# Altium footprint library devices.PCBLIB: 335 footprints (part 3 of 21)
Each footprint in its own frame and in the unit in brackets; x right, y up, seen from the top. Pads: shape width x height; smd on the part's side, far side on the other; paste and mask are expansions set on the pad; w line width, h text height; cw(c..) or ccw(c..) is an arc to the next point about the centre after c.
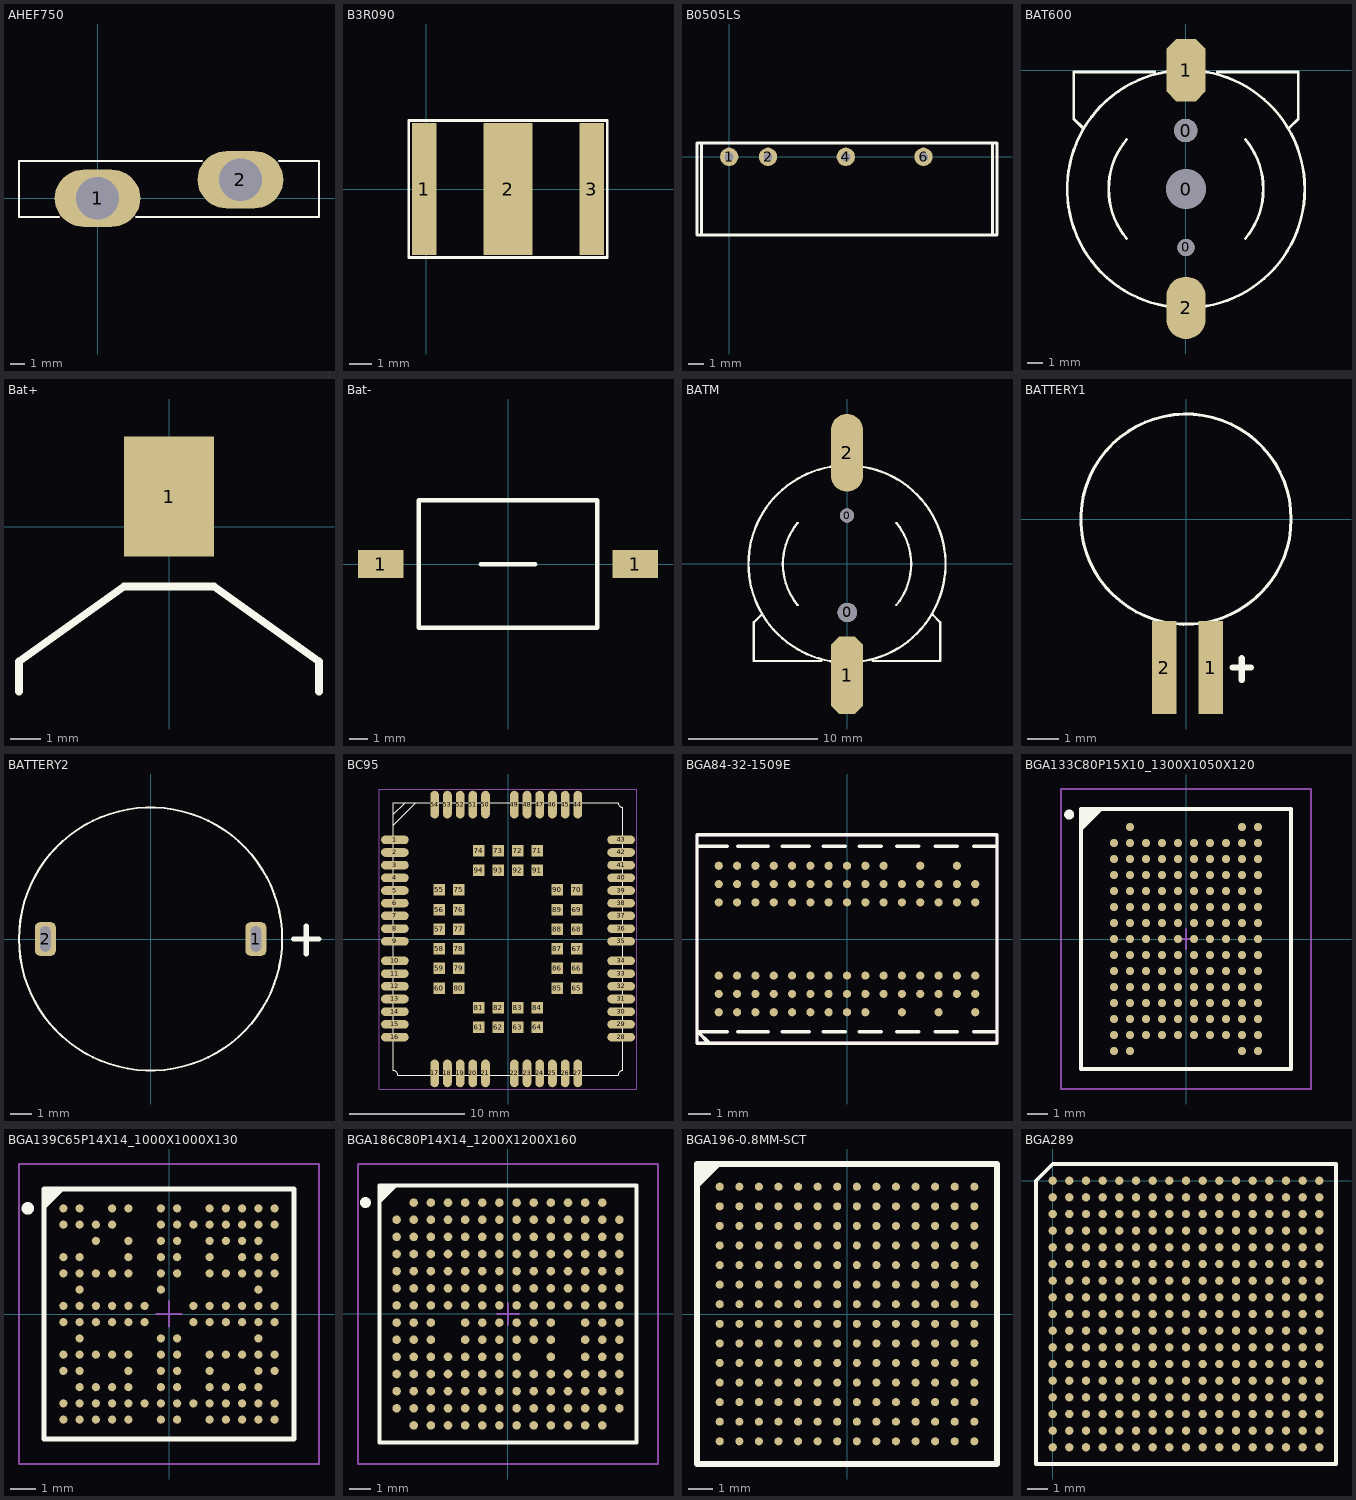
[diagram p2: the footprints below, top view; thin cyan lines are the x and y axes]

## AHEF750 [mm]
pads (2):
  oval 6x4 hole 3: 1(0,0) 2(10,1.3)
Top Overlay:
  lines w0.127: -2.7,-1.3 -5,-1.3 -5.5,-1.3 -5.5,2.6 -5,2.6 7.3,2.6 ; 2.7,-1.3 15,-1.3 15.5,-1.3 15.5,2.6 15,2.6 12.7,2.6

## B3R090 [mm]
pads (3):
  rect 1.1x6 smd: 1(-0.1,0) 3(7.5,0)
  rect 2.2x6 smd: 2(3.7,0)
Top Overlay:
  lines w0.127: -0.8,-3.1 8.2,-3.1 8.2,3.1 -0.8,3.1 -0.8,-3.1

## B0505LS [mm]
pads (4):
  round 1.2 hole 0.6: 1(0,0) 2(2.54,0) 4(7.62,0) 6(12.7,0)
Top Overlay:
  lines w0.2: -1.8,-5.1 -1.8,0.9 ; 17.2,-5.1 17.2,0.9 ; -2.1,-5.1 17.5,-5.1 17.5,0.9 -2.1,0.9 -2.1,-5.1

## BAT600 [mm]
pads (5):
  round 1.5 hole 1.5: 0(-0.014,-3.866)
  round 1.1 hole 1.1: 0(0.011,-11.366)
  round 2.54 hole 2.54: 0(0.011,-7.616)
  oct 2.5x4 smd: 1(0.011,0.004)
  oval 2.5x4 smd: 2(0.011,-15.236)
Top Overlay:
  lines w0.178: -6.614,-3.691 -7.189,-3.116 -7.189,-0.116 -1.989,-0.116 ; -3.802,-10.788 cw(c0.011,-7.616) -3.799,-4.441 ; -0.823,-15.19 cw(c0.011,-7.616) -0.823,-0.042 ; 0.844,-15.19 ccw(c0.011,-7.616) 7.631,-7.616 ccw(c0.011,-7.616) 0.844,-0.042 ; 2.011,-0.116 7.211,-0.116 7.211,-3.116 6.611,-3.716 ; 3.823,-10.788 ccw(c0.011,-7.616) 3.825,-4.447

## Bat+ [mm]
pads (1):
  rect 3x4 smd: 1(0,1)
Top Overlay:
  lines w0.254: -5,-5.5 -5,-4.5 -1.5,-2 1.5,-2 5,-4.5 5,-5.5

## Bat- [mil]
pads (2):
  rect 98x60 smd: 1(-275.59,0) 1(275.59,0)
Top Overlay:
  lines w10: -59.06,-0.87 59.06,-0.87 ; -192.91,-137.8 -192.91,137.8 192.91,137.8 192.91,-137.8 -192.91,-137.8

## BATM [mm]
pads (4):
  round 1.1 hole 1.1 unplated: 0(0,3.748)
  round 1.5 hole 1.5 unplated: 0(0.025,-3.752)
  oct 2.5x6 smd: 1(0,-8.602)
  oval 2.5x6 smd: 2(0,8.598)
Top Overlay:
  lines w0.178: -6.6,-3.902 -7.2,-4.502 -7.2,-7.502 -2,-7.502 ; -3.815,-3.171 cw(c0,-0.002) -3.812,3.171 ; -0.833,-7.576 cw(c0,-0.002) -7.62,-0.002 cw(c0,-0.002) -0.833,7.573 ; 0.833,-7.576 ccw(c0,-0.002) 0.833,7.573 ; 2,-7.502 7.2,-7.502 7.2,-4.502 6.625,-3.927 ; 3.81,-3.177 ccw(c0,-0.002) 3.812,3.171

## BATTERY1 [mm] "BAT1"
pads (2):
  rect 0.8x3 smd: 1(0.8,-4.8) 2(-0.7,-4.8)
Top Overlay:
  circle w0.1: c0,0 r3.4
  lines w0.2: 1.5,-4.8 2.1,-4.8 ; 1.8,-5.2 1.8,-4.5

## BATTERY2 [mm] "BAT"
height 5
pads (2):
  rrect50% 1x1.6 hole 0.5 slot 1.2 at 90 deg: 1(5,0) 2(-5,0)
Top Overlay:
  circle w0.1: c0,0 r6.25
  lines w0.254: 6.8,0 8,0 ; 7.4,-0.7 7.4,0.6

## BC95 [mm]
pads (94):
  oval 2.4x0.75 smd: 1(-9.8,8.6) 2(-9.8,7.5) 3(-9.8,6.4) 4(-9.8,5.3) 5(-9.8,4.2) 6(-9.8,3.1) 7(-9.8,2) 8(-9.8,0.9) 9(-9.8,-0.2) 10(-9.8,-1.9) 11(-9.8,-3) 12(-9.8,-4.1) 13(-9.8,-5.2) 14(-9.8,-6.3) 15(-9.8,-7.4) 16(-9.8,-8.5) 28(9.8,-8.5) 29(9.8,-7.4) 30(9.8,-6.3) 31(9.8,-5.2) 32(9.8,-4.1) 33(9.8,-3) 34(9.8,-1.9) 35(9.8,-0.2) 36(9.8,0.9) 37(9.8,2) 38(9.8,3.1) 39(9.8,4.2) 40(9.8,5.3) 41(9.8,6.4) 42(9.8,7.5) 43(9.8,8.6)
  oval 0.75x2.4 smd: 17(-6.35,-11.65) 18(-5.25,-11.65) 19(-4.15,-11.65) 20(-3.05,-11.65) 21(-1.95,-11.65) 22(0.55,-11.65) 23(1.65,-11.65) 24(2.75,-11.65) 25(3.85,-11.65) 26(4.95,-11.65) 27(6.05,-11.65) 44(6.05,11.65) 45(4.95,11.65) 46(3.85,11.65) 47(2.75,11.65) 48(1.65,11.65) 49(0.55,11.65) 50(-1.95,11.65) 51(-3.05,11.65) 52(-4.15,11.65) 53(-5.25,11.65) 54(-6.35,11.65)
  rect 1x1 smd: 55(-5.95,4.25) 56(-5.95,2.55) 57(-5.95,0.85) 58(-5.95,-0.85) 59(-5.95,-2.55) 60(-5.95,-4.25) 61(-2.55,-7.65) 62(-0.85,-7.65) 63(0.85,-7.65) 64(2.55,-7.65) 65(5.95,-4.25) 66(5.95,-2.55) 67(5.95,-0.85) 68(5.95,0.85) 69(5.95,2.55) 70(5.95,4.25) 71(2.55,7.65) 72(0.85,7.65) 73(-0.85,7.65) 74(-2.55,7.65) 75(-4.25,4.25) 76(-4.25,2.55) 77(-4.25,0.85) 78(-4.25,-0.85) 79(-4.25,-2.55) 80(-4.25,-4.25) 81(-2.55,-5.95) 82(-0.85,-5.95) 83(0.85,-5.95) 84(2.55,-5.95) 85(4.25,-4.25) 86(4.25,-2.55) 87(4.25,-0.85) 88(4.25,0.85) 89(4.25,2.55) 90(4.25,4.25) 91(2.55,5.95) 92(0.85,5.95) 93(-0.85,5.95) 94(-2.55,5.95)
Top Overlay:
  lines w0.1: -9.95,9.851 -8.001,11.8 -9.271,11.8 ; -9.95,10.033 -9.95,11.375 ; -9.95,10.414 -9.95,11.8 ; -9.931,10.82 -8.966,11.786 ; -8.437,11.8 -9.95,11.8 ; -9.95,11.8 9.55,11.8 ccw(c9.95,11.8) 9.95,11.4 9.95,-11.4 ccw(c9.95,-11.8) 9.55,-11.8 -9.55,-11.8 ccw(c-9.95,-11.8) -9.95,-11.4 -9.95,11.8
Mechanical 1:
  lines w0.01: -11.15,-13 -11.15,13 11.15,13 11.15,-13 -11.15,-13

## BGA84-32-1509E [mil] "BGA84-32-1509E"
pads (84):
  round 14 smd: A1(-220.47,-125.98) A2(-220.47,-94.49) A3(-220.47,-62.99) A7(-220.47,62.99) A8(-220.47,94.49) A9(-220.47,125.98) B1(-188.98,-125.98) B2(-188.98,-94.49) B3(-188.98,-62.99) B7(-188.98,62.99) B8(-188.98,94.49) B9(-188.98,125.98) C1(-157.48,-125.98) C2(-157.48,-94.49) C3(-157.48,-62.99) C7(-157.48,62.99) C8(-157.48,94.49) C9(-157.48,125.98) D1(-125.98,-125.98) D2(-125.98,-94.49) D3(-125.98,-62.99) D7(-125.98,62.99) D8(-125.98,94.49) D9(-125.98,125.98) E1(-94.49,-125.98) E2(-94.49,-94.49) E3(-94.49,-62.99) E7(-94.49,62.99) E8(-94.49,94.49) E9(-94.49,125.98) F1(-62.99,-125.98) F2(-62.99,-94.49) F3(-62.99,-62.99) F7(-62.99,62.99) F8(-62.99,94.49) F9(-62.99,125.98) G1(-31.5,-125.98) G2(-31.5,-94.49) G3(-31.5,-62.99) G7(-31.5,62.99) G8(-31.5,94.49) G9(-31.5,125.98) H1(0,-125.98) H2(0,-94.49) H3(0,-62.99) H7(0,62.99) H8(0,94.49) H9(0,125.98) J1(31.5,-125.98) J2(31.5,-94.49) J3(31.5,-62.99) J7(31.5,62.99) J8(31.5,94.49) J9(31.5,125.98) K2(62.99,-94.49) K3(62.99,-62.99) K7(62.99,62.99) K8(62.99,94.49) K9(62.99,125.98) L1(94.49,-125.98) L2(94.49,-94.49) L3(94.49,-62.99) L7(94.49,62.99) L8(94.49,94.49) M2(125.98,-94.49) M3(125.98,-62.99) M7(125.98,62.99) M8(125.98,94.49) M9(125.98,125.98) N1(157.48,-125.98) N2(157.48,-94.49) N3(157.48,-62.99) N7(157.48,62.99) N8(157.48,94.49) P2(188.98,-94.49) P3(188.98,-62.99) P7(188.98,62.99) P8(188.98,94.49) P9(188.98,125.98) R1(220.47,-125.98) R2(220.47,-94.49) R3(220.47,-62.99) R7(220.47,62.99) R8(220.47,94.49)
Top Overlay:
  lines w6: -254.62,159.45 -205.62,159.45 ; -238.11,-177.94 -254.62,-161.43 -254.62,-159.45 -205.62,-159.45 ; -188,-159.45 -135,-159.45 ; -188,159.45 -135,159.45 ; -111,-159.45 -65,-159.45 ; -111,159.45 -65,159.45 ; -40.75,-159.45 -2.87,-159.45 ; -40.75,159.45 -2.87,159.45 ; 20.89,-159.45 58.77,-159.45 ; 20.89,159.45 58.77,159.45 ; 85.73,-159.45 123.61,-159.45 ; 85.73,159.45 123.61,159.45 ; 151.77,-159.45 189.65,-159.45 ; 151.77,159.45 189.65,159.45 ; 217.87,-159.45 255.75,-159.45 ; 217.87,159.45 255.75,159.45 ; -257.87,-179.13 -257.87,179.13 257.87,179.13 257.87,-179.13 -257.87,-179.13
Mechanical 11:
  lines w6: -257.87,-179.13 -257.87,179.13 257.87,179.13 257.87,-179.13 -257.87,-179.13

## BGA133C80P15X10_1300X1050X120 [mm] "BGA, 133-Leads, Body 13.0x10.5mm,  Pitch 0.80mm"
height 1.2
pads (137):
  round 0.41 smd: A2(-2.8,5.6) A9(2.8,5.6) A10(3.6,5.6) B1(-3.6,4.8) B2(-2.8,4.8) B3(-2,4.8) B4(-1.2,4.8) B5(-0.4,4.8) B6(0.4,4.8) B7(1.2,4.8) B8(2,4.8) B9(2.8,4.8) B10(3.6,4.8) C1(-3.6,4) C2(-2.8,4) C3(-2,4) C4(-1.2,4) C5(-0.4,4) C6(0.4,4) C7(1.2,4) C8(2,4) C9(2.8,4) C10(3.6,4) D1(-3.6,3.2) D2(-2.8,3.2) D3(-2,3.2) D4(-1.2,3.2) D5(-0.4,3.2) D6(0.4,3.2) D7(1.2,3.2) D8(2,3.2) D9(2.8,3.2) D10(3.6,3.2) E1(-3.6,2.4) E2(-2.8,2.4) E3(-2,2.4) E4(-1.2,2.4) E5(-0.4,2.4) E6(0.4,2.4) E7(1.2,2.4) E8(2,2.4) E9(2.8,2.4) E10(3.6,2.4) F1(-3.6,1.6) F2(-2.8,1.6) F3(-2,1.6) F4(-1.2,1.6) F5(-0.4,1.6) F6(0.4,1.6) F7(1.2,1.6) F8(2,1.6) F9(2.8,1.6) F10(3.6,1.6) G1(-3.6,0.8) G2(-2.8,0.8) G3(-2,0.8) G4(-1.2,0.8) G5(-0.4,0.8) G6(0.4,0.8) G7(1.2,0.8) G8(2,0.8) G9(2.8,0.8) G10(3.6,0.8) H1(-3.6,0) H2(-2.8,0) H3(-2,0) H4(-1.2,0) H5(-0.4,0) H6(0.4,0) H7(1.2,0) H8(2,0) H9(2.8,0) H10(3.6,0) J1(-3.6,-0.8) J2(-2.8,-0.8) J3(-2,-0.8) J4(-1.2,-0.8) J5(-0.4,-0.8) J6(0.4,-0.8) J7(1.2,-0.8) J8(2,-0.8) J9(2.8,-0.8) J10(3.6,-0.8) K1(-3.6,-1.6) K2(-2.8,-1.6) K3(-2,-1.6) K4(-1.2,-1.6) K5(-0.4,-1.6) K6(0.4,-1.6) K7(1.2,-1.6) K8(2,-1.6) K9(2.8,-1.6) K10(3.6,-1.6) L1(-3.6,-2.4) L2(-2.8,-2.4) L3(-2,-2.4) L4(-1.2,-2.4) L5(-0.4,-2.4) L6(0.4,-2.4) L7(1.2,-2.4) L8(2,-2.4) L9(2.8,-2.4) L10(3.6,-2.4) M1(-3.6,-3.2) M2(-2.8,-3.2) M3(-2,-3.2) M4(-1.2,-3.2) M5(-0.4,-3.2) M6(0.4,-3.2) M7(1.2,-3.2) M8(2,-3.2) M9(2.8,-3.2) M10(3.6,-3.2) N1(-3.6,-4) N2(-2.8,-4) N3(-2,-4) N4(-1.2,-4) N5(-0.4,-4) N6(0.4,-4) N7(1.2,-4) N8(2,-4) N9(2.8,-4) N10(3.6,-4) P1(-3.6,-4.8) P2(-2.8,-4.8) P3(-2,-4.8) P4(-1.2,-4.8) P5(-0.4,-4.8) P6(0.4,-4.8) P7(1.2,-4.8) P8(2,-4.8) P9(2.8,-4.8) P10(3.6,-4.8) R1(-3.6,-5.6) R2(-2.8,-5.6) R9(2.8,-5.6) R10(3.6,-5.6)
Top Overlay:
  circle w0.25: c-5.84,6.223 r0.125
  region: -4.25,6.5 -5.25,5.5 -5.25,6.5
  lines w0.2: -5.25,5.5 -4.25,6.5 ; -5.25,-6.5 5.25,-6.5 5.25,6.5 -5.25,6.5 -5.25,-6.5
Mechanical 13:
  lines w0.1: -5.25,-6.5 5.25,-6.5 5.25,6.5 -5.25,6.5 -5.25,-6.5
Mechanical 15:
  lines w0.1: -0.5,0 0.5,0 ; 0,-0.5 0,0.5 ; -6.25,-7.5 6.25,-7.5 6.25,7.5 -6.25,7.5 -6.25,-7.5
3D body: height 1.2, standoff 0.25, extent -5.25,-6.5 5.25,6.5

## BGA139C65P14X14_1000X1000X130 [mm] "BGA, 139-Leads, Body 10.0x10.0mm,  Pitch 0.65mm"
height 1.3
pads (139):
  round 0.33 smd: A1(-4.225,4.225) A2(-3.575,4.225) A4(-2.275,4.225) A5(-1.625,4.225) A7(-0.325,4.225) A8(0.325,4.225) A10(1.625,4.225) A11(2.275,4.225) A12(2.925,4.225) A13(3.575,4.225) A14(4.225,4.225) B1(-4.225,3.575) B2(-3.575,3.575) B3(-2.925,3.575) B4(-2.275,3.575) B7(-0.325,3.575) B8(0.325,3.575) B9(0.975,3.575) B10(1.625,3.575) B11(2.275,3.575) B12(2.925,3.575) B13(3.575,3.575) B14(4.225,3.575) C3(-2.925,2.925) C5(-1.625,2.925) C7(-0.325,2.925) C8(0.325,2.925) C10(1.625,2.925) C11(2.275,2.925) C12(2.925,2.925) C13(3.575,2.925) D1(-4.225,2.275) D2(-3.575,2.275) D5(-1.625,2.275) D7(-0.325,2.275) D8(0.325,2.275) D10(1.625,2.275) D12(2.925,2.275) D13(3.575,2.275) D14(4.225,2.275) E1(-4.225,1.625) E2(-3.575,1.625) E3(-2.925,1.625) E4(-2.275,1.625) E5(-1.625,1.625) E7(-0.325,1.625) E8(0.325,1.625) E10(1.625,1.625) E11(2.275,1.625) E12(2.925,1.625) E13(3.575,1.625) E14(4.225,1.625) F2(-3.575,0.975) F7(-0.325,0.975) F13(3.575,0.975) G1(-4.225,0.325) G2(-3.575,0.325) G3(-2.925,0.325) G4(-2.275,0.325) G5(-1.625,0.325) G6(-0.975,0.325) G9(0.975,0.325) G10(1.625,0.325) G11(2.275,0.325) G12(2.925,0.325) G13(3.575,0.325) G14(4.225,0.325) H1(-4.225,-0.325) H2(-3.575,-0.325) H3(-2.925,-0.325) H4(-2.275,-0.325) H5(-1.625,-0.325) H6(-0.975,-0.325) H9(0.975,-0.325) H10(1.625,-0.325) H11(2.275,-0.325) H12(2.925,-0.325) H13(3.575,-0.325) H14(4.225,-0.325) J2(-3.575,-0.975) J7(-0.325,-0.975) J8(0.325,-0.975) J13(3.575,-0.975) K1(-4.225,-1.625) K2(-3.575,-1.625) K3(-2.925,-1.625) K4(-2.275,-1.625) K5(-1.625,-1.625) K7(-0.325,-1.625) K8(0.325,-1.625) K10(1.625,-1.625) K11(2.275,-1.625) K12(2.925,-1.625) K13(3.575,-1.625) K14(4.225,-1.625) L1(-4.225,-2.275) L2(-3.575,-2.275) L5(-1.625,-2.275) L7(-0.325,-2.275) L8(0.325,-2.275) L10(1.625,-2.275) L13(3.575,-2.275) L14(4.225,-2.275) M2(-3.575,-2.925) M3(-2.925,-2.925) M4(-2.275,-2.925) M5(-1.625,-2.925) M7(-0.325,-2.925) M8(0.325,-2.925) M10(1.625,-2.925) M11(2.275,-2.925) M12(2.925,-2.925) M13(3.575,-2.925) N1(-4.225,-3.575) N2(-3.575,-3.575) N3(-2.925,-3.575) N4(-2.275,-3.575) N5(-1.625,-3.575) N6(-0.975,-3.575) N7(-0.325,-3.575) N8(0.325,-3.575) N9(0.975,-3.575) N10(1.625,-3.575) N11(2.275,-3.575) N12(2.925,-3.575) N13(3.575,-3.575) N14(4.225,-3.575) P1(-4.225,-4.225) P2(-3.575,-4.225) P3(-2.925,-4.225) P4(-2.275,-4.225) P5(-1.625,-4.225) P7(-0.325,-4.225) P8(0.325,-4.225) P10(1.625,-4.225) P11(2.275,-4.225) P12(2.925,-4.225) P13(3.575,-4.225) P14(4.225,-4.225)
Top Overlay:
  circle w0.25: c-5.65,4.225 r0.125
  region: -4.299,5 -5,4.299 -5,5
  lines w0.2: -5,4.299 -4.299,5 ; -5,-5 5,-5 5,5 -5,5 -5,-5
Mechanical 13:
  lines w0.1: -5,-5 5,-5 5,5 -5,5 -5,-5
Mechanical 15:
  lines w0.1: -0.5,0 0.5,0 ; 0,-0.5 0,0.5 ; -6,-6 6,-6 6,6 -6,6 -6,-6
3D body: height 1.3, standoff 0.41, extent -5,-5 5,5

## BGA186C80P14X14_1200X1200X160 [mm] "BGA, 186-Leads, Body 12.0x12.0mm,  Pitch 0.80mm"
height 1.6
pads (186):
  round 0.4 smd: A2(-4.4,5.2) A3(-3.6,5.2) A4(-2.8,5.2) A5(-2,5.2) A6(-1.2,5.2) A7(-0.4,5.2) A8(0.4,5.2) A9(1.2,5.2) A10(2,5.2) A11(2.8,5.2) A12(3.6,5.2) A13(4.4,5.2) B1(-5.2,4.4) B2(-4.4,4.4) B3(-3.6,4.4) B4(-2.8,4.4) B5(-2,4.4) B6(-1.2,4.4) B7(-0.4,4.4) B8(0.4,4.4) B9(1.2,4.4) B10(2,4.4) B11(2.8,4.4) B12(3.6,4.4) B13(4.4,4.4) B14(5.2,4.4) C1(-5.2,3.6) C2(-4.4,3.6) C3(-3.6,3.6) C4(-2.8,3.6) C5(-2,3.6) C6(-1.2,3.6) C7(-0.4,3.6) C8(0.4,3.6) C9(1.2,3.6) C10(2,3.6) C11(2.8,3.6) C12(3.6,3.6) C13(4.4,3.6) C14(5.2,3.6) D1(-5.2,2.8) D2(-4.4,2.8) D3(-3.6,2.8) D4(-2.8,2.8) D5(-2,2.8) D6(-1.2,2.8) D7(-0.4,2.8) D8(0.4,2.8) D9(1.2,2.8) D10(2,2.8) D11(2.8,2.8) D12(3.6,2.8) D13(4.4,2.8) D14(5.2,2.8) E1(-5.2,2) E2(-4.4,2) E3(-3.6,2) E4(-2.8,2) E5(-2,2) E6(-1.2,2) E7(-0.4,2) E8(0.4,2) E9(1.2,2) E10(2,2) E11(2.8,2) E12(3.6,2) E13(4.4,2) E14(5.2,2) F1(-5.2,1.2) F2(-4.4,1.2) F3(-3.6,1.2) F4(-2.8,1.2) F5(-2,1.2) F6(-1.2,1.2) F7(-0.4,1.2) F8(0.4,1.2) F9(1.2,1.2) F10(2,1.2) F11(2.8,1.2) F12(3.6,1.2) F13(4.4,1.2) F14(5.2,1.2) G1(-5.2,0.4) G2(-4.4,0.4) G3(-3.6,0.4) G4(-2.8,0.4) G5(-2,0.4) G6(-1.2,0.4) G7(-0.4,0.4) G8(0.4,0.4) G9(1.2,0.4) G10(2,0.4) G11(2.8,0.4) G12(3.6,0.4) G13(4.4,0.4) G14(5.2,0.4) H1(-5.2,-0.4) H2(-4.4,-0.4) H3(-3.6,-0.4) H5(-2,-0.4) H6(-1.2,-0.4) H7(-0.4,-0.4) H8(0.4,-0.4) H9(1.2,-0.4) H10(2,-0.4) H12(3.6,-0.4) H13(4.4,-0.4) H14(5.2,-0.4) J1(-5.2,-1.2) J2(-4.4,-1.2) J3(-3.6,-1.2) J5(-2,-1.2) J6(-1.2,-1.2) J7(-0.4,-1.2) J8(0.4,-1.2) J9(1.2,-1.2) J10(2,-1.2) J12(3.6,-1.2) J13(4.4,-1.2) J14(5.2,-1.2) K1(-5.2,-2) K2(-4.4,-2) K3(-3.6,-2) K4(-2.8,-2) K5(-2,-2) K6(-1.2,-2) K7(-0.4,-2) K8(0.4,-2) K10(2,-2) K12(3.6,-2) K13(4.4,-2) K14(5.2,-2) L1(-5.2,-2.8) L2(-4.4,-2.8) L3(-3.6,-2.8) L4(-2.8,-2.8) L5(-2,-2.8) L6(-1.2,-2.8) L7(-0.4,-2.8) L8(0.4,-2.8) L9(1.2,-2.8) L10(2,-2.8) L11(2.8,-2.8) L12(3.6,-2.8) L13(4.4,-2.8) L14(5.2,-2.8) M1(-5.2,-3.6) M2(-4.4,-3.6) M3(-3.6,-3.6) M4(-2.8,-3.6) M5(-2,-3.6) M6(-1.2,-3.6) M7(-0.4,-3.6) M8(0.4,-3.6) M9(1.2,-3.6) M10(2,-3.6) M11(2.8,-3.6) M12(3.6,-3.6) M13(4.4,-3.6) M14(5.2,-3.6) N1(-5.2,-4.4) N2(-4.4,-4.4) N3(-3.6,-4.4) N4(-2.8,-4.4) N5(-2,-4.4) N6(-1.2,-4.4) N7(-0.4,-4.4) N8(0.4,-4.4) N9(1.2,-4.4) N10(2,-4.4) N11(2.8,-4.4) N12(3.6,-4.4) N13(4.4,-4.4) N14(5.2,-4.4) P2(-4.4,-5.2) P3(-3.6,-5.2) P4(-2.8,-5.2) P5(-2,-5.2) P6(-1.2,-5.2) P7(-0.4,-5.2) P8(0.4,-5.2) P9(1.2,-5.2) P10(2,-5.2) P11(2.8,-5.2) P12(3.6,-5.2) P13(4.4,-5.2)
Top Overlay:
  circle w0.25: c-6.65,5.2 r0.125
  region: -5.249,6 -6,5.249 -6,6
  lines w0.2: -6,5.249 -5.249,6 ; -6,-6 6,-6 6,6 -6,6 -6,-6
Mechanical 13:
  lines w0.1: -6,-6 6,-6 6,6 -6,6 -6,-6
Mechanical 15:
  lines w0.1: -0.5,0 0.5,0 ; 0,-0.5 0,0.5 ; -7,-7 7,-7 7,7 -7,7 -7,-7
3D body: height 1.6, standoff 0.34, extent -6,-6 6,6

## BGA196-0.8MM-SCT [mil]
pads (196):
  round 13 smd mask+2.39: A1(-204.72,204.72) A2(-173.23,204.72) A3(-141.73,204.72) A4(-110.24,204.72) A5(-78.74,204.72) A6(-47.24,204.72) A7(-15.75,204.72) A8(15.75,204.72) A9(47.24,204.72) A10(78.74,204.72) A11(110.24,204.72) A12(141.73,204.72) A13(173.23,204.72) A14(204.72,204.72) B1(-204.72,173.23) B2(-173.23,173.23) B3(-141.73,173.23) B4(-110.24,173.23) B5(-78.74,173.23) B6(-47.24,173.23) B7(-15.75,173.23) B8(15.75,173.23) B9(47.24,173.23) B10(78.74,173.23) B11(110.24,173.23) B12(141.73,173.23) B13(173.23,173.23) B14(204.72,173.23) C1(-204.72,141.73) C2(-173.23,141.73) C3(-141.73,141.73) C4(-110.24,141.73) C5(-78.74,141.73) C6(-47.24,141.73) C7(-15.75,141.73) C8(15.75,141.73) C9(47.24,141.73) C10(78.74,141.73) C11(110.24,141.73) C12(141.73,141.73) C13(173.23,141.73) C14(204.72,141.73) D1(-204.72,110.24) D2(-173.23,110.24) D3(-141.73,110.24) D4(-110.24,110.24) D5(-78.74,110.24) D6(-47.24,110.24) D7(-15.75,110.24) D8(15.75,110.24) D9(47.24,110.24) D10(78.74,110.24) D11(110.24,110.24) D12(141.73,110.24) D13(173.23,110.24) D14(204.72,110.24) E1(-204.72,78.74) E2(-173.23,78.74) E3(-141.73,78.74) E4(-110.24,78.74) E5(-78.74,78.74) E6(-47.24,78.74) E7(-15.75,78.74) E8(15.75,78.74) E9(47.24,78.74) E10(78.74,78.74) E11(110.24,78.74) E12(141.73,78.74) E13(173.23,78.74) E14(204.72,78.74) F1(-204.72,47.24) F2(-173.23,47.24) F3(-141.73,47.24) F4(-110.24,47.24) F5(-78.74,47.24) F6(-47.24,47.24) F7(-15.75,47.24) F8(15.75,47.24) F9(47.24,47.24) F10(78.74,47.24) F11(110.24,47.24) F12(141.73,47.24) F13(173.23,47.24) F14(204.72,47.24) G1(-204.72,15.75) G2(-173.23,15.75) G3(-141.73,15.75) G4(-110.24,15.75) G5(-78.74,15.75) G6(-47.24,15.75) G7(-15.75,15.75) G8(15.75,15.75) G9(47.24,15.75) G10(78.74,15.75) G11(110.24,15.75) G12(141.73,15.75) G13(173.23,15.75) G14(204.72,15.75) H1(-204.72,-15.75) H2(-173.23,-15.75) H3(-141.73,-15.75) H4(-110.24,-15.75) H5(-78.74,-15.75) H6(-47.24,-15.75) H7(-15.75,-15.75) H8(15.75,-15.75) H9(47.24,-15.75) H10(78.74,-15.75) H11(110.24,-15.75) H12(141.73,-15.75) H13(173.23,-15.75) H14(204.72,-15.75) J1(-204.72,-47.24) J2(-173.23,-47.24) J3(-141.73,-47.24) J4(-110.24,-47.24) J5(-78.74,-47.24) J6(-47.24,-47.24) J7(-15.75,-47.24) J8(15.75,-47.24) J9(47.24,-47.24) J10(78.74,-47.24) J11(110.24,-47.24) J12(141.73,-47.24) J13(173.23,-47.24) J14(204.72,-47.24) K1(-204.72,-78.74) K2(-173.23,-78.74) K3(-141.73,-78.74) K4(-110.24,-78.74) K5(-78.74,-78.74) K6(-47.24,-78.74) K7(-15.75,-78.74) K8(15.75,-78.74) K9(47.24,-78.74) K10(78.74,-78.74) K11(110.24,-78.74) K12(141.73,-78.74) K13(173.23,-78.74) K14(204.72,-78.74) L1(-204.72,-110.24) L2(-173.23,-110.24) L3(-141.73,-110.24) L4(-110.24,-110.24) L5(-78.74,-110.24) L6(-47.24,-110.24) L7(-15.75,-110.24) L8(15.75,-110.24) L9(47.24,-110.24) L10(78.74,-110.24) L11(110.24,-110.24) L12(141.73,-110.24) L13(173.23,-110.24) L14(204.72,-110.24) M1(-204.72,-141.73) M2(-173.23,-141.73) M3(-141.73,-141.73) M4(-110.24,-141.73) M5(-78.74,-141.73) M6(-47.24,-141.73) M7(-15.75,-141.73) M8(15.75,-141.73) M9(47.24,-141.73) M10(78.74,-141.73) M11(110.24,-141.73) M12(141.73,-141.73) M13(173.23,-141.73) M14(204.72,-141.73) N1(-204.72,-173.23) N2(-173.23,-173.23) N3(-141.73,-173.23) N4(-110.24,-173.23) N5(-78.74,-173.23) N6(-47.24,-173.23) N7(-15.75,-173.23) N8(15.75,-173.23) N9(47.24,-173.23) N10(78.74,-173.23) N11(110.24,-173.23) N12(141.73,-173.23) N13(173.23,-173.23) N14(204.72,-173.23) P1(-204.72,-204.72) P2(-173.23,-204.72) P3(-141.73,-204.72) P4(-110.24,-204.72) P5(-78.74,-204.72) P6(-47.24,-204.72) P7(-15.75,-204.72) P8(15.75,-204.72) P9(47.24,-204.72) P10(78.74,-204.72) P11(110.24,-204.72) P12(141.73,-204.72) P13(173.23,-204.72) P14(204.72,-204.72)
Top Overlay:
  lines w10: -241.27,207.9 -207.91,241.26 ; -241.27,218.46 -218.47,241.26 ; -241.27,228.92 -228.93,241.26 ; -241.27,-241.25 -241.27,241.26 241.22,241.26 241.22,-241.25 -241.27,-241.25

## BGA289 [mm]
pads (289):
  round 0.4 smd: A1(-0.01,0.012) A2(0.79,0.012) A3(1.59,0.012) A4(2.39,0.012) A5(3.19,0.012) A6(3.99,0.012) A7(4.79,0.012) A8(5.59,0.012) A9(6.39,0.012) A10(7.19,0.012) A11(7.99,0.012) A12(8.79,0.012) A13(9.59,0.012) A14(10.39,0.012) A15(11.19,0.012) A16(11.99,0.012) A17(12.79,0.012) B1(-0.01,-0.788) B2(0.79,-0.788) B3(1.59,-0.788) B4(2.39,-0.788) B5(3.19,-0.788) B6(3.99,-0.788) B7(4.79,-0.788) B8(5.59,-0.788) B9(6.39,-0.788) B10(7.19,-0.788) B11(7.99,-0.788) B12(8.79,-0.788) B13(9.59,-0.788) B14(10.39,-0.788) B15(11.19,-0.788) B16(11.99,-0.788) B17(12.79,-0.788) C1(-0.01,-1.588) C2(0.79,-1.588) C3(1.59,-1.588) C4(2.39,-1.588) C5(3.19,-1.588) C6(3.99,-1.588) C7(4.79,-1.588) C8(5.59,-1.588) C9(6.39,-1.588) C10(7.19,-1.588) C11(7.99,-1.588) C12(8.79,-1.588) C13(9.59,-1.588) C14(10.39,-1.588) C15(11.19,-1.588) C16(11.99,-1.588) C17(12.79,-1.588) D1(-0.01,-2.388) D2(0.79,-2.388) D3(1.59,-2.388) D4(2.39,-2.388) D5(3.19,-2.388) D6(3.99,-2.388) D7(4.79,-2.388) D8(5.59,-2.388) D9(6.39,-2.388) D10(7.19,-2.388) D11(7.99,-2.388) D12(8.79,-2.388) D13(9.59,-2.388) D14(10.39,-2.388) D15(11.19,-2.388) D16(11.99,-2.388) D17(12.79,-2.388) E1(-0.01,-3.188) E2(0.79,-3.188) E3(1.59,-3.188) E4(2.39,-3.188) E5(3.19,-3.188) E6(3.99,-3.188) E7(4.79,-3.188) E8(5.59,-3.188) E9(6.39,-3.188) E10(7.19,-3.188) E11(7.99,-3.188) E12(8.79,-3.188) E13(9.59,-3.188) E14(10.39,-3.188) E15(11.19,-3.188) E16(11.99,-3.188) E17(12.79,-3.188) F1(-0.01,-3.988) F2(0.79,-3.988) F3(1.59,-3.988) F4(2.39,-3.988) F5(3.19,-3.988) F6(3.99,-3.988) F7(4.79,-3.988) F8(5.59,-3.988) F9(6.39,-3.988) F10(7.19,-3.988) F11(7.99,-3.988) F12(8.79,-3.988) F13(9.59,-3.988) F14(10.39,-3.988) F15(11.19,-3.988) F16(11.99,-3.988) F17(12.79,-3.988) G1(-0.01,-4.788) G2(0.79,-4.788) G3(1.59,-4.788) G4(2.39,-4.788) G5(3.19,-4.788) G6(3.99,-4.788) G7(4.79,-4.788) G8(5.59,-4.788) G9(6.39,-4.788) G10(7.19,-4.788) G11(7.99,-4.788) G12(8.79,-4.788) G13(9.59,-4.788) G14(10.39,-4.788) G15(11.19,-4.788) G16(11.99,-4.788) G17(12.79,-4.788) H1(-0.01,-5.588) H2(0.79,-5.588) H3(1.59,-5.588) H4(2.39,-5.588) H5(3.19,-5.588) H6(3.99,-5.588) H7(4.79,-5.588) H8(5.59,-5.588) H9(6.39,-5.588) H10(7.19,-5.588) H11(7.99,-5.588) H12(8.79,-5.588) H13(9.59,-5.588) H14(10.39,-5.588) H15(11.19,-5.588) H16(11.99,-5.588) H17(12.79,-5.588) J1(-0.01,-6.388) J2(0.79,-6.388) J3(1.59,-6.388) J4(2.39,-6.388) J5(3.19,-6.388) J6(3.99,-6.388) J7(4.79,-6.388) J8(5.59,-6.388) J9(6.39,-6.388) J10(7.19,-6.388) J11(7.99,-6.388) J12(8.79,-6.388) J13(9.59,-6.388) J14(10.39,-6.388) J15(11.19,-6.388) J16(11.99,-6.388) J17(12.79,-6.388) K1(-0.01,-7.188) K2(0.79,-7.188) K3(1.59,-7.188) K4(2.39,-7.188) K5(3.19,-7.188) K6(3.99,-7.188) K7(4.79,-7.188) K8(5.59,-7.188) K9(6.39,-7.188) K10(7.19,-7.188) K11(7.99,-7.188) K12(8.79,-7.188) K13(9.59,-7.188) K14(10.39,-7.188) K15(11.19,-7.188) K16(11.99,-7.188) K17(12.79,-7.188) L1(-0.01,-7.988) L2(0.79,-7.988) L3(1.59,-7.988) L4(2.39,-7.988) L5(3.19,-7.988) L6(3.99,-7.988) L7(4.79,-7.988) L8(5.59,-7.988) L9(6.39,-7.988) L10(7.19,-7.988) L11(7.99,-7.988) L12(8.79,-7.988) L13(9.59,-7.988) L14(10.39,-7.988) L15(11.19,-7.988) L16(11.99,-7.988) L17(12.79,-7.988) M1(-0.01,-8.788) M2(0.79,-8.788) M3(1.59,-8.788) M4(2.39,-8.788) M5(3.19,-8.788) M6(3.99,-8.788) M7(4.79,-8.788) M8(5.59,-8.788) M9(6.39,-8.788) M10(7.19,-8.788) M11(7.99,-8.788) M12(8.79,-8.788) M13(9.59,-8.788) M14(10.39,-8.788) M15(11.19,-8.788) M16(11.99,-8.788) M17(12.79,-8.788) N1(-0.01,-9.588) N2(0.79,-9.588) N3(1.59,-9.588) N4(2.39,-9.588) N5(3.19,-9.588) N6(3.99,-9.588) N7(4.79,-9.588) N8(5.59,-9.588) N9(6.39,-9.588) N10(7.19,-9.588) N11(7.99,-9.588) N12(8.79,-9.588) N13(9.59,-9.588) N14(10.39,-9.588) N15(11.19,-9.588) N16(11.99,-9.588) N17(12.79,-9.588) P1(-0.01,-10.388) P2(0.79,-10.388) P3(1.59,-10.388) P4(2.39,-10.388) P5(3.19,-10.388) P6(3.99,-10.388) P7(4.79,-10.388) P8(5.59,-10.388) P9(6.39,-10.388) P10(7.19,-10.388) P11(7.99,-10.388) P12(8.79,-10.388) P13(9.59,-10.388) P14(10.39,-10.388) P15(11.19,-10.388) P16(11.99,-10.388) P17(12.79,-10.388) R1(-0.01,-11.188) R2(0.79,-11.188) R3(1.59,-11.188) R4(2.39,-11.188) R5(3.19,-11.188) R6(3.99,-11.188) R7(4.79,-11.188) R8(5.59,-11.188) R9(6.39,-11.188) R10(7.19,-11.188) R11(7.99,-11.188) R12(8.79,-11.188) R13(9.59,-11.188) R14(10.39,-11.188) R15(11.19,-11.188) R16(11.99,-11.188) R17(12.79,-11.188) T1(-0.01,-11.988) T2(0.79,-11.988) T3(1.59,-11.988) T4(2.39,-11.988) T5(3.19,-11.988) T6(3.99,-11.988) T7(4.79,-11.988) T8(5.59,-11.988) T9(6.39,-11.988) T10(7.19,-11.988) T11(7.99,-11.988) T12(8.79,-11.988) T13(9.59,-11.988) T14(10.39,-11.988) T15(11.19,-11.988) T16(11.99,-11.988) T17(12.79,-11.988) U1(-0.01,-12.788) U2(0.79,-12.788) U3(1.59,-12.788) U4(2.39,-12.788) U5(3.19,-12.788) U6(3.99,-12.788) U7(4.79,-12.788) U8(5.59,-12.788) U9(6.39,-12.788) U10(7.19,-12.788) U11(7.99,-12.788) U12(8.79,-12.788) U13(9.59,-12.788) U14(10.39,-12.788) U15(11.19,-12.788) U16(11.99,-12.788) U17(12.79,-12.788)
Top Overlay:
  lines w0.178: 13.59,-13.588 13.59,-12.788 13.59,0.012 13.59,0.812 ; 13.59,-13.588 13.59,-13.588 ; 13.59,-13.588 12.79,-13.588 -0.01,-13.588 -0.81,-13.588 -0.81,-12.788 -0.81,0.012 -0.01,0.812 12.79,0.812 13.59,0.812 ; 13.59,0.812 13.59,0.812